# Altium footprint library PVV.PcbLib: 88 footprints (part 6 of 6)
Each footprint in its own frame and in the unit in brackets; x right, y up, seen from the top. Pads: shape width x height; smd on the part's side, far side on the other; paste and mask are expansions set on the pad; w line width, h text height; cw(c..) or ccw(c..) is an arc to the next point about the centre after c.
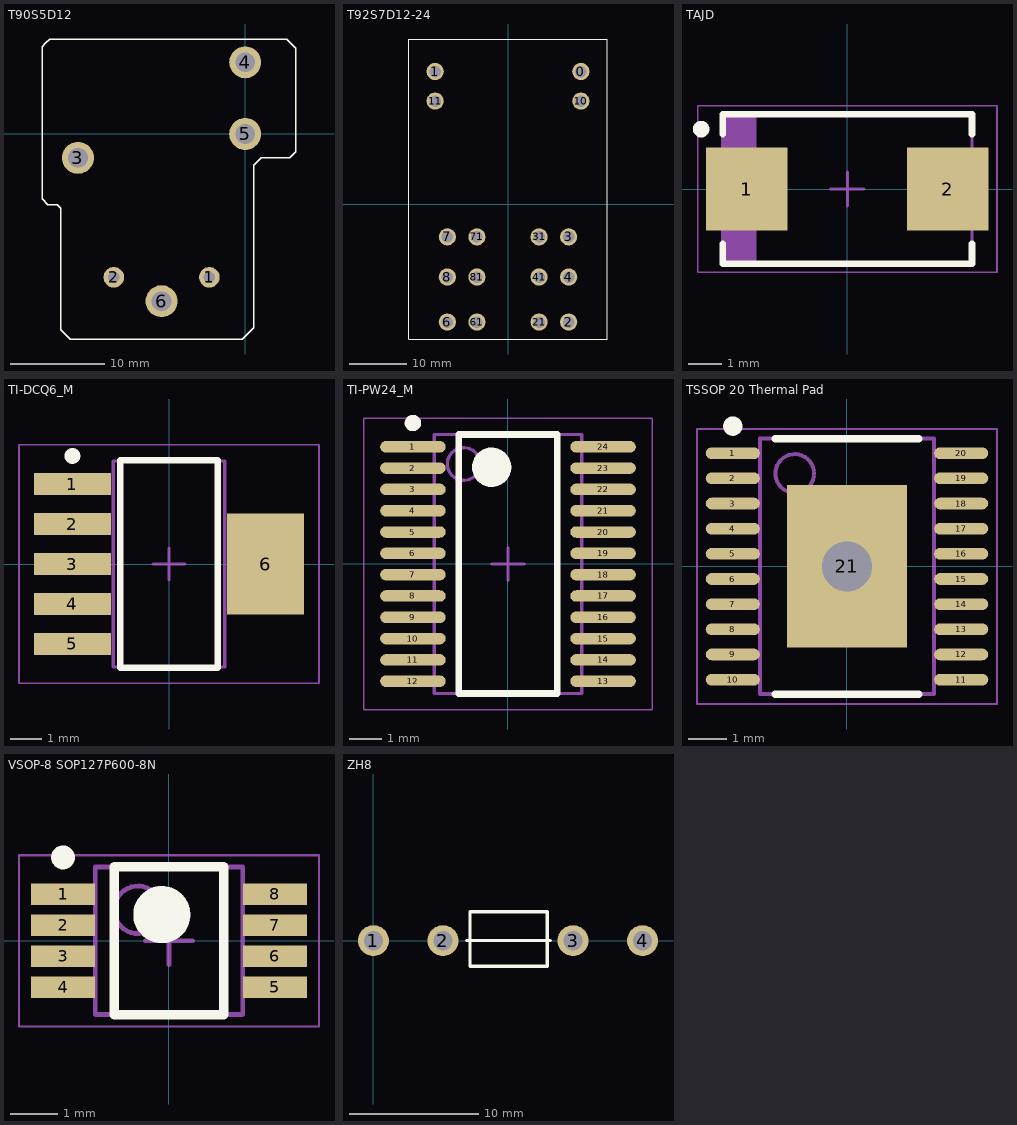
[diagram p5: the footprints below, top view; thin cyan lines are the x and y axes]

## T90S5D12 [mm]
pads (6):
  round 2.2 hole 1.2: 1(-3.81,-15.24) 2(-13.97,-15.24)
  round 3.4 hole 2.1: 3(-17.78,-2.54) 4(0,7.62) 5(0,0) 6(-8.89,-17.78)
Top Overlay:
  lines w0.152: -21.6,-6.9 -21.6,9.3 -21.2,9.7 -20.8,10.1 -0.5,10.1 4.4,10.1 5.4,9.1 5.4,-1.9 4.76,-2.54 4.06,-2.54 1.7,-2.54 0.92,-3.32 0.92,-9.33 0.92,-20.58 -0.3,-21.8 -18.6,-21.8 -19.6,-20.8 -19.6,-7.9 -20,-7.5 -21,-7.5 -21.6,-6.9
3D body "c-3-1393209-1-b-3d.stp": height 20.1, standoff -3.29, extent -21.564,-21.793 5.334,10.059

## T92S7D12-24 [mm]
pads (16):
  round 3 hole 2: 0(12.7,23.13) 1(-12.7,23.13) 2(10.58,-20.55) 3(10.58,-5.69) 4(10.58,-12.7) 6(-10.58,-20.55) 7(-10.58,-5.69) 8(-10.58,-12.7) 10(12.7,17.97) 11(-12.7,17.97) 21(5.42,-20.55) 31(5.42,-5.69) 41(5.42,-12.7) 61(-5.42,-20.55) 71(-5.42,-5.69) 81(-5.42,-12.7)
Top Overlay:
  lines w0.152: -17.3,-23.5 17.3,-23.5 17.3,28.8 -17.3,28.8 -17.3,-23.5
3D body "T92_3d.stp": height 30.75, standoff -3.95, extent -17.272,-23.545 17.272,28.779

## TAJD [mm] "Molded Capacitor, 2-Leads, Body 7,30x4,35mm, IPC Medium Density"
height 2
pads (2):
  rect 2.45x2.5 smd: 1(-3.025,0) 2(3.025,0)
Top Overlay:
  circle w0.25: c-4.4,1.8 r0.125
  lines w0.2: -3.75,-1.65 -3.75,-2.25 3.75,-2.25 3.75,-1.65 ; -3.75,1.65 -3.75,2.25 3.75,2.25 3.75,1.65
Mechanical 13:
  rectangle: -3.75,-2.25 -2.741,2.25
  lines w0.1: -3.75,-2.25 3.75,-2.25 3.75,2.25 -3.75,2.25 -3.75,-2.25
Mechanical 15:
  lines w0.05: -4.5,-2.5 4.5,-2.5 4.5,2.5 -4.5,2.5 -4.5,-2.5
  lines w0.1: -0.5,0 0.5,0 ; 0,-0.5 0,0.5
3D body "User Library-Tantalum Cap Case D.STEP": height 2.8, standoff 0, extent -3.57,-2.15 3.57,2.15

## TI-DCQ6_M [mm] "SOT223, 6-Leads, Body 6.5x3.5mm, Pitch 1.27mm, IPC Low Density"
height 1.8
pads (6):
  rect 2.45x0.7 smd: 1(-3.075,2.54) 2(-3.075,1.27) 3(-3.075,0) 4(-3.075,-1.27) 5(-3.075,-2.54)
  rect 2.45x3.2 smd: 6(3.075,0)
Top Overlay:
  circle w0.25: c-3.075,3.44 r0.125
  lines w0.2: -1.55,-3.3 -1.55,3.3 1.55,3.3 1.55,-3.3 -1.55,-3.3
Mechanical 13:
  lines w0.1: -1.775,-3.275 -1.775,3.275 1.775,3.275 1.775,-3.275 -1.775,-3.275
Mechanical 15:
  lines w0.05: -4.775,-3.8 -4.775,3.8 4.775,3.8 4.775,-3.8 -4.775,-3.8
  lines w0.1: -0.5,0 0.5,0 ; 0,-0.5 0,0.5
3D body "User Library-TPS73701DCQ.step": height 1.8, standoff 0, extent -3.63,-3.275 3.63,3.275

## TI-PW24_M [mm] "SOP, 24-Leads, Body 7.8x4.4mm, Pitch 0.65mm, IPC Low Density"
height 1.2
pads (24):
  oval 2x0.35 smd: 1(-2.9,3.575) 2(-2.9,2.925) 3(-2.9,2.275) 4(-2.9,1.625) 5(-2.9,0.975) 6(-2.9,0.325) 7(-2.9,-0.325) 8(-2.9,-0.975) 9(-2.9,-1.625) 10(-2.9,-2.275) 11(-2.9,-2.925) 12(-2.9,-3.575) 13(2.9,-3.575) 14(2.9,-2.925) 15(2.9,-2.275) 16(2.9,-1.625) 17(2.9,-0.975) 18(2.9,-0.325) 19(2.9,0.325) 20(2.9,0.975) 21(2.9,1.625) 22(2.9,2.275) 23(2.9,2.925) 24(2.9,3.575)
Top Overlay:
  circle w0.6: c-0.5,2.95 r0.3
  circle w0.25: c-2.9,4.3 r0.125
  lines w0.2: -1.5,-3.95 1.5,-3.95 1.5,3.95 -1.5,3.95 -1.5,-3.95
Mechanical 13:
  circle w0.1: c-1.35,3.05 r0.5
  lines w0.1: -2.25,-3.95 2.25,-3.95 2.25,3.95 -2.25,3.95 -2.25,-3.95
Mechanical 15:
  lines w0.05: -4.4,-4.45 4.4,-4.45 4.4,4.45 -4.4,4.45 -4.4,-4.45
  lines w0.1: -0.5,0 0.5,0 ; 0,-0.5 0,0.5
3D body: height 1.2, standoff 0.05, extent -2.25,-3.95 2.25,3.95

## TSSOP 20 Thermal Pad [mm] "TSOP, 20-Leads, Body 6,50x4,40mm, Pitch 0,65mm, Thermal Pad 4,20x3,10mm, IPC Medium Density"
height 1.1
pads (21):
  oval 1.4x0.3 smd: 1(-2.95,2.925) 2(-2.95,2.275) 3(-2.95,1.625) 4(-2.95,0.975) 5(-2.95,0.325) 6(-2.95,-0.325) 7(-2.95,-0.975) 8(-2.95,-1.625) 9(-2.95,-2.275) 10(-2.95,-2.925) 11(2.95,-2.925) 12(2.95,-2.275) 13(2.95,-1.625) 14(2.95,-0.975) 15(2.95,-0.325) 16(2.95,0.325) 17(2.95,0.975) 18(2.95,1.625) 19(2.95,2.275) 20(2.95,2.925)
  rect 3.1x4.2 smd: 21(0,0)
via 0,0 diameter 2 hole 1.3
Top Overlay:
  circle w0.25: c-2.95,3.625 r0.125
  lines w0.2: -1.85,-3.3 1.85,-3.3 ; -1.85,3.3 1.85,3.3
Mechanical 13:
  circle w0.1: c-1.35,2.4 r0.5
  lines w0.1: -2.25,-3.3 2.25,-3.3 2.25,3.3 -2.25,3.3 -2.25,-3.3
Mechanical 15:
  lines w0.05: -3.875,-3.55 3.875,-3.55 3.875,3.55 -3.875,3.55 -3.875,-3.55
  lines w0.1: -0.5,0 0.5,0 ; 0,-0.5 0,0.5
3D body "TSOP 20 Thermal Pad.step": height 1.1, standoff 0, extent -3.187,-3.3 3.187,3.3

## VSOP-8 SOP127P600-8N [mm] "VSOP-8"
height 1.1
pads (8):
  rect 1.35x0.45 smd: 1(-2.225,0.975) 2(-2.225,0.325) 3(-2.225,-0.325) 4(-2.225,-0.975) 5(2.225,-0.975) 6(2.225,-0.325) 7(2.225,0.325) 8(2.225,0.975)
Top Overlay:
  circle w0.25: c-2.225,1.75 r0.125
  circle w0.6: c-0.15,0.55 r0.3
  lines w0.2: -1.15,-1.55 -1.15,1.55 1.15,1.55 1.15,-1.55 -1.15,-1.55
Mechanical 13:
  circle w0.1: c-0.65,0.65 r0.5
  lines w0.1: -1.55,-1.55 -1.55,1.55 1.55,1.55 1.55,-1.55 -1.55,-1.55
Mechanical 15:
  lines w0.05: -3.15,-1.8 -3.15,1.8 3.15,1.8 3.15,-1.8 -3.15,-1.8
  lines w0.1: -0.5,0 0.5,0 ; 0,-0.5 0,0.5
3D body "VSOP-8 SOP127P600-8N.step": height 1.1, standoff 0, extent -2.45,-1.55 2.45,1.55

## ZH8 [mm] "Fuse Holder"
pads (4):
  round 2.4 hole 1.5: 1(0,0) 2(5.4,0) 3(15.5,0) 4(20.9,0)
Top Overlay:
  lines w0.254: 7.25,0 13.75,0 ; 7.5,-2 13.5,-2 13.5,2.25 7.5,2.25 7.5,-2
3D body "User Library-Clips FH-100 with fuse 5x20.STEP": height 10, standoff -3.49, extent 0,-3.5 20.8,3.5